# Altium schematic symbol library Hydra_Ref_sch.SCHLIB: 791 symbols (part 3 of 5)
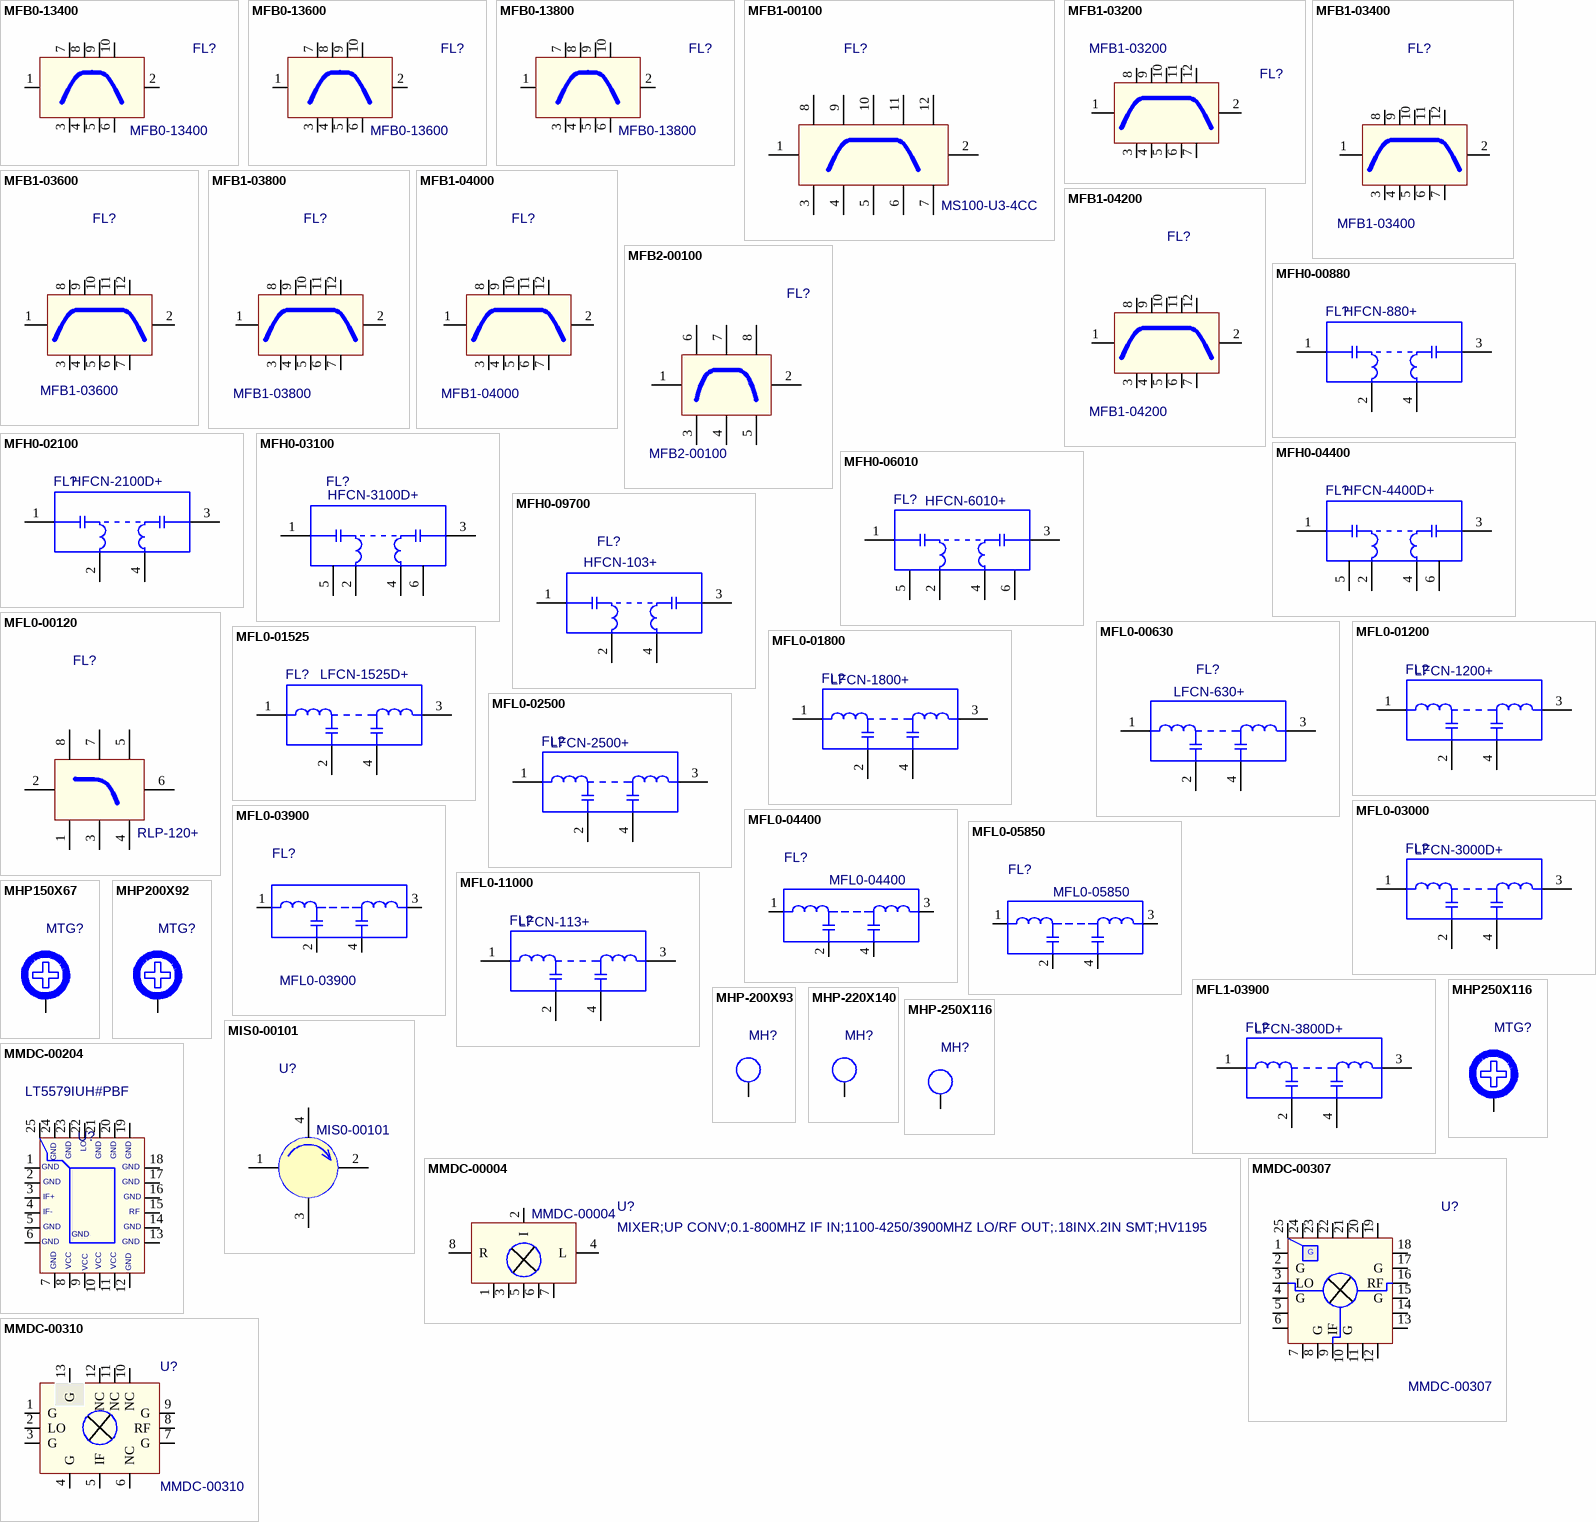
[diagram p24: symbols MFB0-13400 to MMDC-00310]

## MFH0-06010
designator FL?, comment M_PN: HFCN-6010+  (hidden comment: FILTER;HI PASS;6010MHz;5SEC;FV1206;RoHS)
MFGR: MINI-CIRCUITS; G_PN: MFH0-06010; Approved: CL; Value: HFCN-6010+; NoLoad: .; level: 1; ModifyDate: 3/12/13; item_number: MFH0-06010
footprint FV1206-1 (MINI-CIRCUITS FV1206-1)
pins: 1 IN, 2 GND, 3 OUT, 4 GND, 5 GND, 6 GND

## MFH0-09700
designator FL?, comment M_PN: HFCN-103+  (hidden comment: FILTER;HI PASS;9700MHz;7SEC;FV1206-4;RoHS)
MFGR: MINI-CIRCUITS; G_PN: MFH0-09700; Approved: CL; Value: HFCN-103+; NoLoad: .; level: 1; ModifyDate: 1/22/15; item_number: MFH0-09700
footprint FV1206-4 (FV1206-4 Mini-Circuits)
pins: 1 IN, 2 GND, 3 OUT, 4 GND

## MFL0-00120
designator FL?, comment M_PN: RLP-120+  (hidden comment: FILTER;LOWPASS;120MHZ;SHARP SLOPE;METAL SHIELDED;GP731 SMT-8)
G_PN: MFL0-00120; NoLoad: .; Approved: CL; Value: RLP-120+; MFGR: MINI_CIRCUITS; level: 1; ModifyDate: 02/22/12; item_number: MFL0-00120
footprint FIL-GP731 (CASE STYLE GP731 -Mini-Circuit)
footprint FIL-GP731 6-GND PINS (CASE STYLE GP731 -Mini-Circuit)
pins: 1, 2, 3, 4, 5, 6, 7, 8

## MFL0-00630
designator FL?, comment M_PN: LFCN-630+  (hidden comment: FILTER;LOW PASS;630MHz;7SEC;FV1206)
MFGR: MINI-CIRCUITS; G_PN: MFL0-00630; Approved: CL; Value: LFCN-630+; NoLoad: .; level: 1; ModifyDate: 02/22/12; item_number: MFL0-00630
footprint FIL-FV1206-4P (LFCN -3800)
pins: 1 IN, 2 GND, 3 OUT, 4 GND

## MFL0-01200
designator FL?, comment M_PN: LFCN-1200+  (hidden comment: LOW PASS FILTER, 1200 MHz, SMT. FV1206, RoHS)
MFGR: MINI-CIRCUITS; G_PN: MFL0-01200; Approved: CL; Value: LFCN-1200+; NoLoad: .; level: 1; ModifyDate: 02/22/12; item_number: MFL0-01200
footprint FIL-FV1206-4P (LFCN -3800)
pins: 1 IN, 2 GND, 3 OUT, 4 GND

## MFL0-01525
designator FL?, comment M_PN: LFCN-1525D+  (hidden comment: FILTER;LO PASS;1.525GHz;7 SECTION;10W;1206;RoHS)
MFGR: MINI-CIRCUITS; G_PN: MFL0-01525; Approved: CL; Value: LFCN-1525D+; NoLoad: .; level: 1; ModifyDate: 11/10/15; item_number: MFL0-01525
footprint FV1206 (FV1206 Mini-Circuits)
pins: 1 IN, 2 GND, 3 OUT, 4 GND

## MFL0-01800
designator FL?, comment M_PN: LFCN-1800+  (hidden comment: FILTER;LOW PASS;1800MHZ;7SECTIONS;10W;FV1206;RoHS)
MFGR: MINI-CIRCUITS; G_PN: MFL0-01800; Approved: NM; Value: LFCN-1800+; NoLoad: .; level: 1; ModifyDate: 11/17/12; item_number: MFL0-01800
footprint FV1206 (FV1206 Mini-Circuits)
pins: 1 IN, 2 GND, 3 OUT, 4 GND

## MFL0-02500
designator FL?, comment M_PN: LFCN-2500+  (hidden comment: FILTER;LOW PASS;2.500GHZ;5 SECTIONS;1A;1206)
MFGR: MINI-CIRCUITS; G_PN: MFL0-02500; Approved: CL; Value: LFCN-2500+; NoLoad: .; level: 1; ModifyDate: 3/5/13; item_number: MFL0-02500
footprint FV1206 (FV1206 Mini-Circuits)
pins: 1 IN, 2 GND, 3 OUT, 4 GND

## MFL0-03000
designator FL?, comment M_PN: LFCN-3000D+  (hidden comment: LTER;LOW PASS;3.000GHZ;7 SECTIONS;.5A;1206)
MFGR: MINI-CIRCUITS; G_PN: MFL0-03000; Approved: CL; Value: LFCN-3000D+; NoLoad: .; level: 1; ModifyDate: 3/8/13; item_number: MFL0-03000
footprint FV1206 (FV1206 Mini-Circuits)
pins: 1 IN, 2 GND, 3 OUT, 4 GND

## MFL0-03900
designator FL?, comment G_PN: MFL0-03900  (hidden comment: FILTER;LOW PASS;3900MHz;7SEC;FV1206)
NoLoad: .; MFGR: Mini-Circuits; Approved: NM; level: 1; ModifyDate: 11/17/12; M_PN: LFCN-3800; item_number: MFL0-03900
footprint FV1206 (FV1206 Mini-Circuits)
pins: 1 IN, 2 OUT, 3 GND, 4 GND

## MFL0-04400
designator FL?, comment G_PN: MFL0-04400  (hidden comment: FILTER;LOW PASS;4400MHz;7SEC;FV1206)
NoLoad: .; MFGR: Mini-Circuits; Approved: NM; level: 1; Value: LFCN-4400; ModifyDate: 11/17/12; M_PN: LFCN-4400; item_number: MFL0-04400
footprint FV1206 (FV1206 Mini-Circuits)
pins: 1 IN, 2 OUT, 3 GND, 4 GND

## MFL0-05850
designator FL?, comment G_PN: MFL0-05850  (hidden comment: FILTER;LOW PASS;5.85GHZ;7 SECTIONS;FV1206)
NoLoad: .; Value: LFCN-5850D+; MFGR: Mini-Circuits; Approved: NM; level: 1; ModifyDate: 3/15/13; M_PN: LFCN-5850D+; item_number: MFL0-05850
footprint FV1206 (Footprint not found)
pins: 1 IN, 2 OUT, 3 GND, 4 GND

## MFL0-11000
designator FL?, comment M_PN: LFCN-113+  (hidden comment: TER;LOW PASS;11.000GHZ;7 SECTIONS;.5A;FV1206-4)
MFGR: MINI-CIRCUITS; G_PN: MFL0-11000; Approved: CL; Value: LFCN-113+; NoLoad: .; level: 1; ModifyDate: 3/14/13; item_number: MFL0-11000
footprint FV1206-4 (FV1206-4 Mini-Circuits)
pins: 1 IN, 2 GND, 3 OUT, 4 GND

## MFL1-03900
designator FL?, comment M_PN: LFCN-3800D+  (hidden comment: FILTER;LOW PASS;3900MHz;7SEC;RoHS;FV1206)
MFGR: MINI-CIRCUITS; G_PN: MFL1-03900; Approved: CL; Value: LFCN-3800D+; NoLoad: .; level: 1; ModifyDate: 3/21/13; item_number: MFL1-03900
footprint FV1206 (Footprint not found)
pins: 1 IN, 2 GND, 3 OUT, 4 GND

## MHP150X67
designator MTG?  (no BOM)
MHP200X92; NoLoad: N/L; level: 1; ModifyDate: 02/14/2008 14:07:19; Value: *
footprint MHP150X67
pins: MH

## MHP200X92
designator MTG?  (no BOM)
MHP200X92; NoLoad: N/L; level: 1; ModifyDate: 02/14/2008 14:07:19; Value: *
footprint MHP200X92
pins: MH

## MHP250X116
designator MTG?  (no BOM)
MHP250X116; NoLoad: N/L; level: 1; ModifyDate: 8/8/13; Value: *
footprint MHP-250X116 (Mounting PT Hole .116" Pad .250" (outer layers) and .140" (inner layer))
pins: MH

## MHP-200X93
designator MH?, comment N/L  (value not drawn)  (no BOM)
MHP-200X93; level: 1; NoLoad: N/L; ModifyDate: 02/14/2008 14:07:19; Value: *
footprint MHP-200X93 (Mounting PT Hole .093" Pad .200")
footprint MTG_PAD220B170T140H (Pad 220 on the bottom and 170 on the top side)
pins: MH

## MHP-220X140
designator MH?, comment N/L  (value not drawn)  (no BOM)
MHP-220X140; level: 1; NoLoad: N/L; ModifyDate: 02/14/2008 14:07:19; Value: *
footprint MTG_PAD220B170T140H (Pad 220 on the bottom and 170 on the top side)
footprint MTG_PAD220X140
pins: MH

## MHP-250X116
designator MH?, comment N/L  (value not drawn)  (no BOM)
MHP-250X116; level: 1; NoLoad: N/L; ModifyDate: 02/14/2008 14:07:19; Value: *
footprint MHP-250X116 (Mounting PT Hole .116" Pad .250" (outer layers) and .140" (inner layer))
pins: 1

## MIS0-00101
designator U?, comment G_PN: MIS0-00101  (hidden comment: ISOLATOR;1.165-1.235GHZ;20DB;0.35dB IL;0.98dBSMT)
MFGR: JQL; NoLoad: .; Approved: CL; Value: JCM1165T1235S10R; level: 1; ModifyDate: 4/3/12; M_PN: JCM1165T1235S10R; item_number: MIS0-00101
footprint JCM1165T1235S10R (Isolator)
pins: 1, 2, 3, 4  

## MMDC-00004
designator U?, comment MIXER;UP CONV;0.1-800MHZ IF IN;1100-4250/3900MHZ LO/RF OUT;.18INX.2IN SMT;HV1195  G_PN: MMDC-00004
Approved: NM; MFGR: Mini-Circuits; NoLoad: .; M_PN: SIM-U432+; level: 1; ModifyDate: 11/14/12; item_number: MMDC-00004
footprint HV1195 (SIM-4432H+)
pins: 1, 2 I, 3, 4 L, 5, 6, 7, 8 R

## MMDC-00204
designator U?, comment M_PN: LT5579IUH#PBF  (hidden comment: MIXER;1.5-3.8GHZ;+2DBM;0-1GHZ IF;QFN-24)
Value: LT5579IUH#PBF; NoLoad: .; Approved: CL; MFGR: LINEAR TECH; G_PN: MMDC-00204; level: 1; ModifyDate: 2/26/13; item_number: MMDC-00204
footprint QFN-24_LT (QFN-24 LINEAR TECHNOLOGY)
pins: 1 G, 2 G, 3 IF+, 4 IF-, 5 G, 6 G, 7 G, 8 VCC, 9 VCC, 10 VCC, 11 VCC, 12 G, 13 G, 14 G, 15 RF, 16 G, 17 G, 18 G, 19 G, 20 G, 21 G, 22 LO, 23 G, 24 G, 25 G
text: GND

## MMDC-00307
designator U?, comment G_PN: MMDC-00307  (hidden comment: MIXER;6-12GHZ;+17DBM;0-3GHZ IF;.157INX.157INX.04IN SMT)
Approved: CL; MFGR: MINICIRCUITS; NoLoad: .; Value: HMC557LC4; level: 1; ModifyDate: 3/13/13; M_PN: HMC557LC4; item_number: MMDC-00307
footprint LC4_HITTITE (QFN Plastic Package 157X157X40(mil))
pins: 1 NC, 2 G, 3 LO, 4 G, 5 NC, 6 NC, 7 NC, 8 G, 9 IF, 10 G, 11 NC, 12 NC, 13 NC, 14 NC, 15 G, 16 RF, 17 G, 18 NC, 19 NC, 20 NC, 21 NC, 22 NC, 23 NC, 24 NC, 25 G

## MMDC-00310
designator U?  G_PN: MMDC-00310
MIXER;3-10GHZ;+17DBM;0-4GHZ IF;.118INX.118INX.036IN SMT; MFGR: HITTITE; NoLoad: .; Value: HMC787LC3B; level: 1; ModifyDate: 1/15/14; M_PN: HMC787LC3B; item_number: MMDC-00310
footprint QFN-12_HITTITE_LC3 (Footprint not found)
pins: 1 G, 2 LO "This pin is AC coupled  and matched to 50 Ohms.", 3 G "These pins and package base must  be connected to RF/DC ground.", 4 G "These pins and package base must  be connected to RF/DC ground.", 5 IF "This pad is DC coupled. For applications not requiring  operation to DC, this port should be DC blocked externally  using a series capacitor whose value has been chosen to  pass the necessary IF frequency range. For operation to DC,  this pin must not source or sink more than 2 mA of current or  part non-function and possible part failure will result.", 6 NC, 7 G, 8 RF, 9 G, 10 NC, 11 NC "This pin is AC coupled  and matched to 50 Ohms.", 12 NC "These pins and package base must  be connected to RF/DC ground.", 13 G "PADDLE"

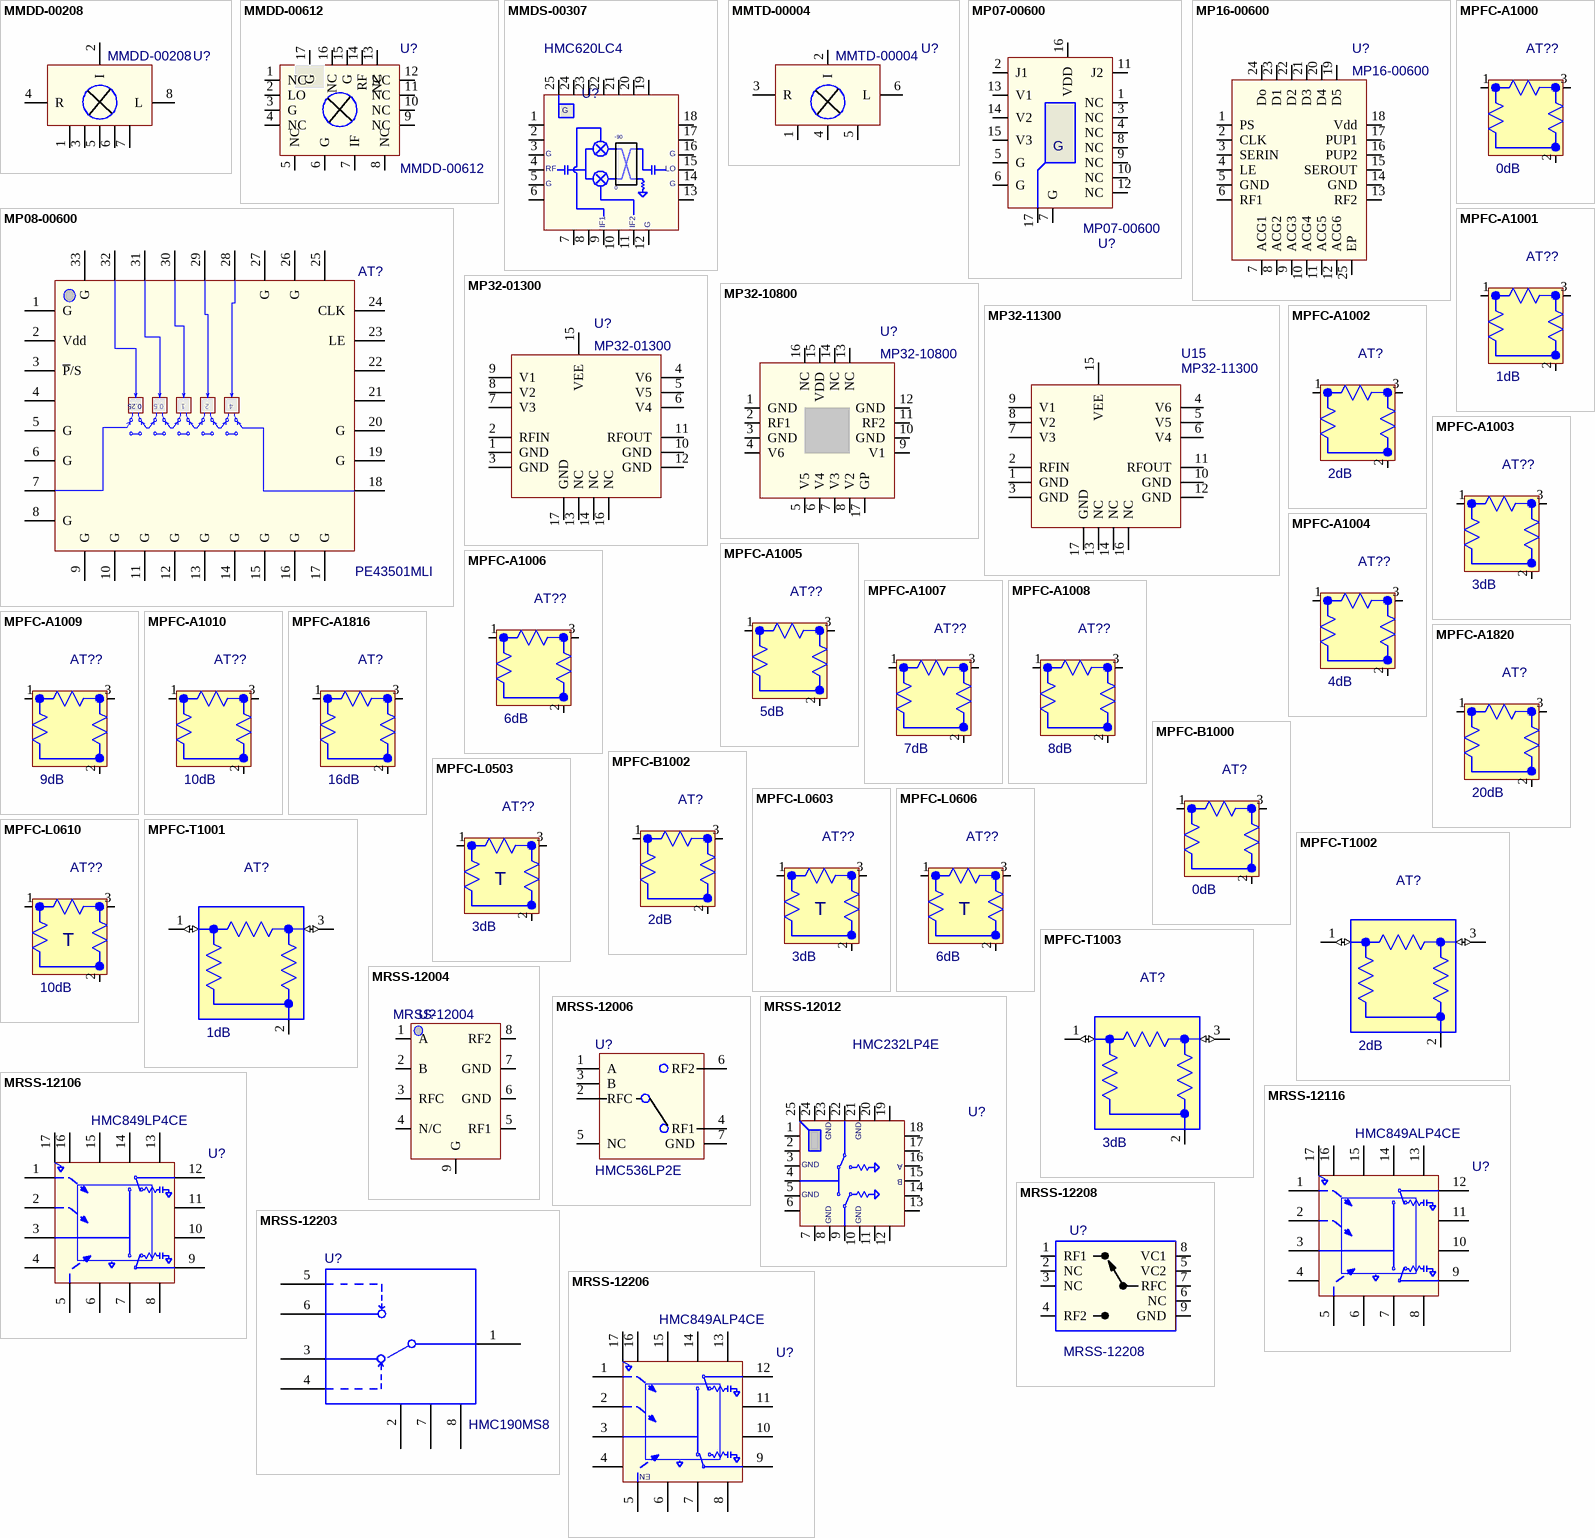
[diagram p10: symbols MMDD-00208 to MRSS-12208]

## MMDD-00208
designator U?, comment G_PN: MMDD-00208  (hidden comment: MIXER;2.3-7.6GHZ;+17DBM;0-3GHZ IF;.18INX.2IN SMT;HV1195)
Approved: NM; MFGR: MINICIRCUITS; NoLoad: .; M_PN: SIM-762H+; level: 1; ModifyDate: 11/14/12; item_number: MMDD-00208
footprint HV1195 (SIM-4432H+)
pins: 1, 2 I, 3, 4 R, 5, 6, 7, 8 L

## MMDD-00612
designator U?  G_PN: MMDD-00612
MIXER;6-12GHZ;+17DBM;0-4GHZ IF;.118INX.118INX.036IN SMT; MFGR: HITTITE; NoLoad: .; Value: HMC663LC3; level: 1; ModifyDate: 9/17/13; M_PN: HMC663LC3; item_number: MMDD-00612
footprint QFN-16_HITTITE_LC3_036 (LC3 – 3 x 3 mm QFN CERAMIC  HIGH FREQUENCY SMT PACKAGE, 36mil height)
pins: 1 NC, 2 LO "This pin is AC coupled  and matched to 50 Ohms.", 3 G "These pins and package base must  be connected to RF/DC ground.", 4 NC, 5 NC, 6 G "These pins and package base must  be connected to RF/DC ground.", 7 IF "This pad is DC coupled. For applications not requiring  operation to DC, this port should be DC blocked externally  using a series capacitor whose value has been chosen to  pass the necessary IF frequency range. For operation to DC,  this pin must not source or sink more than 2 mA of current or  part non-function and possible part failure will result.", 8 NC, 9 NC, 10 NC, 11 NC, 12 NC, 13 NC, 14 RF "This pin is AC coupled  and matched to 50 Ohms.", 15 G "These pins and package base must  be connected to RF/DC ground.", 16 NC, 17 G "PADDLE"

## MMDS-00307
designator U?, comment M_PN: HMC620LC4  (hidden comment: MIXER;3-7GHZ;+15DBM;0-3.5GHZ IF;.157INX.157INX.040IN QFN-24;SSB)
Value: HMC620LC4; NoLoad: .; Approved: CL; MFGR: HITTITE; G_PN: MMDS-00307; level: 1; ModifyDate: 4/12/13; item_number: MMDS-00307
footprint QFN-24_HITTITE (QFN-24 HITTITE)
pins: 1 NC, 2 NC, 3 G, 4 RF, 5 G, 6 NC, 7 NC, 8 NC, 9 IF1, 10 NC, 11 VCC, 12 G, 13 NC, 14 G, 15 LO, 16 G, 17 NC, 18 NC, 19 NC, 20 NC, 21 NC, 22 NC, 23 NC, 24 NC, 25 NC
text: -90; 0; IF2

## MMTD-00004
designator U?, comment G_PN: MMTD-00004  (hidden comment: MIXER;UP CONV;5-3500MHZ IF IN;5-4200MHZ LO/RF;CD542;RoHS)
Approved: NM; MFGR: MINI-CIRCUITS; NoLoad: .; Value: ADE-42MH+; level: 1; ModifyDate: 4/9/13; M_PN: ADE-42MH+; item_number: MMTD-00004
footprint CD542 (Footprint not found)
pins: 1 GND, 2 I, 3 R, 4 GND, 5 GND, 6 L

## MP07-00600
designator U?, comment G_PN: MP07-00600  (hidden comment: ATTENUATOR;3-BIT CONT;7DB;0.5-6GHZ;QFN-16)
M_PN: SKY12325-350LF; MFGR: SKYWORKS; NoLoad: .; Approved: NB; level: 1; Value: *; ModifyDate: 11/8/12; item_number: MP07-00600
footprint QFN50P300x300x80-17N (QFN-16PIN-3MMx3MM_.5mm Pitch .8 mm tall Nominal footprint)
pins: 1 NC, 2 J1, 3 NC, 4 NC, 5 G, 6 G, 7 G, 8 NC, 9 NC, 10 NC, 11 J2, 12 NC, 13 V1, 14 V2, 15 V3, 16 VDD, 17 G

## MP08-00600
designator AT?, comment M_PN: PE43501MLI  (hidden comment: ATTENUATOR;7.75DB;9KHZ-6GHZ;5-BIT S/P CONT;QFN-32)
MFGR: PEREGRINE SEMICONDUCTOR; Approved: CL; NoLoad: .; Value: PE43501MLI; G_PN: MP08-00600; level: 1; ModifyDate: 5/17/12; item_number: MP08-00600
footprint QFN50P500X500X90-33N (QFN, 33-Leads, Body 5x5x0.9mm, Pitch 0.50mm, IPC Medium Density)
pins: 1 G, 2 Vdd, 3 ~{P}/S, 4 A0, 5 G, 6 G, 7 N/C, 8 G, 9 G, 10 G, 11 G, 12 G, 13 G, 14 G, 15 G, 16 G, 17 G, 18 RF2, 19 G, 20 G, 21 A2, 22 A1, 23 LE, 24 CLK, 25 SI, 26 G, 27 G, 28 D4, 29 D3, 30 D2, 31 D1, 32 D0, 33 G
text: 0.25; 0.5

## MP16-00600
designator U?, comment G_PN: MP16-00600  (hidden comment: HMC792LP4E,15.75DB,6-BIT,6 GHz,MMIC ATTEN,.25 dB STEP,IL<4dB,SMT LEADLESS 4mmX4mm PKG.)
MFGR: HITTITE; NoLoad: .; Approved: NM; level: 1; Value: HMC792LP4E; M_PN: HMC792LP4E; ModifyDate: 3/4/13; item_number: MP16-00600
footprint QFN50P400X400X100-25N
pins: 1 PS, 2 CLK, 3 SERIN, 4 LE, 5 GND, 6 RF1, 7 ACG1, 8 ACG2, 9 ACG3, 10 ACG4, 11 ACG5, 12 ACG6, 13 RF2, 14 GND, 15 SEROUT, 16 PUP2, 17 PUP1, 18 Vdd, 19 D5, 20 D4, 21 D3, 22 D2, 23 D1, 24 Do, 25 EP "exposed pad"

## MP32-01300
designator U?, comment G_PN: MP32-01300  (hidden comment: HMC424LP3,32DB,6-BIT,13 GHz,MMIC ATTEN,.5 dB STEP,IL<4dB,SMT LEADLESS 9mmX9mm PKG.)
MFGR: HITTITE; NoLoad: .; Approved: NM; level: 1; Value: *; M_PN: HMC424LP3; ModifyDate: 12/05/12; item_number: MP32-01300
footprint QFN-16_HITTITE_LP3 (QFN-16 HITTITE)
pins: 1 GND, 2 RFIN, 3 GND, 4 V6, 5 V5, 6 V4, 7 V3, 8 V2, 9 V1, 10 GND, 11 RFOUT, 12 GND, 13 NC, 14 NC, 15 VEE, 16 NC, 17 GND

## MP32-10800
designator U?, comment G_PN: MP32-10800  (hidden comment: HMC792LP4E,15.75DB,6-BIHMC425LP3E,32DB,6-BIT,8 GHz,MMIC ATTEN,.5 dB STEP,IL<5B,SMT LEADLESS 3mmX3mm PKG.)
MFGR: HITTITE; NoLoad: .; Approved: CL; level: 1; Value: HMC425LP3E; M_PN: HMC425LP3E; ModifyDate: 5/1/15; item_number: MP32-10800
footprint QFN-16_HITTITE_LP3 (QFN-16 HITTITE)
pins: 1 GND, 2 RF1, 3 GND, 4 V6, 5 V5, 6 V4, 7 V3, 8 V2, 9 V1, 10 GND, 11 RF2, 12 GND, 13 NC, 14 NC, 15 VDD, 16 NC, 17 GP

## MP32-11300
designator U15, comment G_PN: MP32-11300  (hidden comment: HMC424LP3,32DB,6-BIT,13 GHz,MMIC ATTEN,.5 dB STEP,IL<4dB,SMT LEADLESS 3mmX3mm PKG.)
M_PN: HMC424ALP3E; MFGR: HITTITE; NoLoad: .; Approved: CL; Value: *; ModifyDate: 8/2/15; item_number: MP32-11300
footprint QFN-16_HITTITE_LP3 (QFN-16 HITTITE)
pins: 1 GND, 2 RFIN, 3 GND, 4 V6, 5 V5, 6 V4, 7 V3, 8 V2, 9 V1, 10 GND, 11 RFOUT, 12 GND, 13 NC, 14 NC, 15 VEE, 16 NC, 17 GND

## MPFC-A1000
designator AT??, comment value 0dB  (hidden comment: PAD;CHIP;0dB;+/-.3dB;.08 x .05;50 OHM;FACE DOWN)
NoLoad: .; Approved: CL; M_PN: IMS1141-00DB; MFGR: IMS RESISTORS; G_PN: MPFC-A1000; level: 1; ModifyDate: 4/16/13; item_number: MPFC-A1000
footprint ATTN-IMS-0805 (Footprint not found)
pins: 1 IN/OUT, 2 GND (power), 3 IN/OUT

## MPFC-A1001
designator AT??, comment value 1dB  (hidden comment: PAD;CHIP;1dB;+/-.3dB;.08 x .05;50 OHM;FACE DOWN)
NoLoad: .; Approved: CL; M_PN: IMS1141-01DB; MFGR: IMS RESISTORS; G_PN: MPFC-A1001; level: 1; ModifyDate: 3/8/13; item_number: MPFC-A1001
footprint ATTN-IMS-0805 (Footprint not found)
pins: 1 IN/OUT, 2 GND (power), 3 IN/OUT

## MPFC-A1002
designator AT?, comment value 2dB  (hidden comment: PAD;CHIP;2dB;+/-.3dB;.08 x .05;50 OHM;FACE DOWN)
NoLoad: .; Approved: CL; M_PN: IMS1141-02DB; MFGR: IMS RESISTORS; G_PN: MPFC-A1002; level: 1; ModifyDate: 3/8/13; item_number: MPFC-A1002
footprint ATTN-IMS-0805 (Footprint not found)
footprint ATTN-IMS-0805 (ATTENUATOR, 0805, IMS)
pins: 1 IN/OUT, 2 GND (power), 3 IN/OUT

## MPFC-A1003
designator AT??, comment value 3dB  (hidden comment: PAD;CHIP;3dB;+/-.3dB;.08 x .05;50 OHM;FACE DOWN)
NoLoad: .; Approved: CL; M_PN: IMS1141-03DB; MFGR: IMS RESISTORS; G_PN: MPFC-A1003; level: 1; item_number: MPFC-A1003
footprint ATTN-IMS-0805 (Footprint not found)
pins: 1 IN/OUT, 2 GND (power), 3 IN/OUT

## MPFC-A1004
designator AT??, comment value 4dB  (hidden comment: PAD;CHIP;4dB;+/-.3dB;.08 x .05;50 OHM;FACE DOWN)
NoLoad: .; Approved: CL; M_PN: IMS1141-04DB; MFGR: IMS RESISTORS; G_PN: MPFC-A1004; level: 1; ModifyDate: 3/8/13; item_number: MPFC-A1004
footprint ATTN-IMS-0805 (Footprint not found)
pins: 1 IN/OUT, 2 GND (power), 3 IN/OUT

## MPFC-A1005
designator AT??, comment value 5dB  (hidden comment: PAD;CHIP;5dB;+/-.3dB;.08 x .05;50 OHM;FACE DOWN)
NoLoad: .; Approved: CL; M_PN: IMS1141-05DB; MFGR: IMS RESISTORS; G_PN: MPFC-A1005; level: 1; ModifyDate: 3/8/13; item_number: MPFC-A1005
footprint ATTN-IMS-0805 (Footprint not found)
pins: 1 IN/OUT, 2 GND (power), 3 IN/OUT

## MPFC-A1006
designator AT??, comment value 6dB  (hidden comment: PAD;CHIP;6dB;+/-.3dB;.08 x .05;50 OHM;FACE DOWN)
NoLoad: .; Approved: CL; M_PN: IMS1141-06DB; MFGR: IMS RESISTORS; G_PN: MPFC-A1006; level: 1; ModifyDate: 3/8/13; item_number: MPFC-A1006
footprint ATTN-IMS-0805 (Footprint not found)
pins: 1 IN/OUT, 2 GND (power), 3 IN/OUT

## MPFC-A1007
designator AT??, comment value 7dB  (hidden comment: PAD;CHIP;7dB;+/-.3dB;.08 x .05;50 OHM;FACE DOWN)
NoLoad: .; Approved: CL; M_PN: IMS1141-07DB; MFGR: IMS RESISTORS; G_PN: MPFC-A1007; level: 1; ModifyDate: 8/5/14; item_number: MPFC-A1007
footprint ATTN-IMS-0805 (Footprint not found)
pins: 1 IN/OUT, 2 GND (power), 3 IN/OUT

## MPFC-A1008
designator AT??, comment value 8dB  (hidden comment: PAD;CHIP;8dB;+/-.3dB;.08 x .05;50 OHM;FACE DOWN)
NoLoad: .; Approved: CL; M_PN: IMS1141-08DB; MFGR: IMS RESISTORS; G_PN: MPFC-A1008; level: 1; ModifyDate: 4/23/13; item_number: MPFC-A1008
footprint ATTN-IMS-0805 (Footprint not found)
pins: 1 IN/OUT, 2 GND (power), 3 IN/OUT

## MPFC-A1009
designator AT??, comment value 9dB  (hidden comment: PAD;CHIP;9dB;+/-.3dB;.08 x .05;50 OHM;FACE DOWN)
NoLoad: .; Approved: CL; M_PN: IMS1141-09DB; MFGR: IMS RESISTORS; G_PN: MPFC-A1009; level: 1; ModifyDate: 3/.8/13; item_number: MPFC-A1009
footprint ATTN-IMS-0805 (Footprint not found)
pins: 1 IN/OUT, 2 GND (power), 3 IN/OUT

## MPFC-A1010
designator AT??, comment value 10dB  (hidden comment: PAD;CHIP;10dB;+/-.3dB;.08 x .05;50 OHM;FACE DOWN)
NoLoad: .; Approved: CL; M_PN: IMS1141-10DB; MFGR: IMS RESISTORS; G_PN: MPFC-A1010; level: 1; ModifyDate: 4/23/13; item_number: MPFC-A1010
footprint ATTN-IMS-0805 (Footprint not found)
pins: 1 IN/OUT, 2 GND (power), 3 IN/OUT

## MPFC-A1816
designator AT?, comment value 16dB  (hidden comment: PAD;CHIP;16dB;+.5/-4dB;.08 x .06;50 OHM;FACE DOWN)
NoLoad: .; Approved: CL; M_PN: PCAAW-16; MFGR: Aeroflex/Inmet; G_PN: MPFC-A1816; level: 1; ModifyDate: 8/21/14; item_number: MPFC-A1816
footprint PCAAW (Footprint not found)
pins: 1 IN/OUT, 2 GND (power), 3 IN/OUT

## MPFC-A1820
designator AT?, comment value 20dB  (hidden comment: PAD;CHIP;20dB;+.5/-4dB;.08 x .06;50 OHM;FACE DOWN)
NoLoad: .; Approved: CL; M_PN: MPFC-A1820; MFGR: Aeroflex/Inmet; level: 1; ModifyDate: 1/20/15; G_PN: MPFC-A1820; item_number: MPFC-A1820
footprint PCAAW (Footprint not found)
pins: 1 IN/OUT, 2 GND (power), 3 IN/OUT

## MPFC-B1000
designator AT?, comment value 0dB  (hidden comment: PAD;CHIP;0dB;.06 x .03;50 OHM;FACE DOWN)
NoLoad: .; Approved: CL; M_PN: IMS-2533-00DB; MFGR: IMS RESISTORS; G_PN: MPFC-B1000; level: 1; ModifyDate: 6/23/16; item_number: MPFC-B1000
footprint ATTN-IMS-0603 (Footprint not found)
pins: 1 IN/OUT, 2 GND (power), 3 IN/OUT

## MPFC-B1002
designator AT?, comment value 2dB  (hidden comment: PAD;CHIP;2dB;.06 x .03;50 OHM;FACE DOWN)
NoLoad: .; Approved: CL; M_PN: IMS-2533-02DB; MFGR: IMS RESISTORS; G_PN: MPFC-B1002; level: 1; ModifyDate: 10/18/16; item_number: MPFC-B1002
footprint ATTN-IMS-0603 (Footprint not found)
pins: 1 IN/OUT, 2 GND (power), 3 IN/OUT

## MPFC-L0503
designator AT??, comment value 3dB  (hidden comment: TEMP VAR CHIP ATTEN;3DB;-6E-3 TC;DC-6GHz;.147X.123)
NoLoad: .; Approved: CL; M_PN: TVA0300N07W3S; MFGR: EMC TECHNOLOGY; G_PN: MPFC-L0503; level: 1; ModifyDate: 3/13/13; item_number: MPFC-L0503
footprint TVA3S (ATTENUATOR, .140" x .123")
pins: 1 IN/OUT, 2 GND (power), 3 IN/OUT
text: T

## MPFC-L0603
designator AT??, comment value 3dB  (hidden comment: TEMP VAR CHIP ATTEN;3DB;-3E-3 TC;DC-6GHz;.147X.123)
NoLoad: .; Approved: CL; M_PN: TVA0300N03W3F; MFGR: EMC TECHNOLOGY; G_PN: MPFC-L0603; level: 1; ModifyDate: 3/8/13; item_number: MPFC-L0603
footprint TVA0600N03W3F (Footprint not found)
pins: 1 IN/OUT, 2 GND (power), 3 IN/OUT
text: T

## MPFC-L0606
designator AT??, comment value 6dB  (hidden comment: TEMP VARIABLE CHIP ATTENUATOR;6DB;DC-6GHz)
NoLoad: .; Approved: CL; M_PN: TVA0600N03W3F; MFGR: EMC TECHNOLOGY; G_PN: MPFC-L0606; level: 1; ModifyDate: 3/8/13; item_number: MPFC-L0606
footprint TVA0600N03W3F (Footprint not found)
pins: 1 IN/OUT, 2 GND (power), 3 IN/OUT
text: T

## MPFC-L0610
designator AT??, comment value 10dB  (hidden comment: TEMP VAR CHIP ATTEN;10DB;-7E-3 TC;DC-6GHz;.147X.123)
NoLoad: .; Approved: CL; M_PN: TVA1000N07W3S; MFGR: EMC TECHNOLOGY; G_PN: MPFC-L0610; level: 1; ModifyDate: 3/13/13; item_number: MPFC-L0610
footprint TVA3S (Footprint not found)
pins: 1 IN/OUT, 2 GND (power), 3 IN/OUT
text: T

## MPFC-T1001
designator AT?  value 1dB  (hidden comment: MPFC-T1001)
PAD;CHIP;1dB;+/-.3dB;.08 x .05;50 OHM; NoLoad: .; Approved: {Approved}; M_PN: PAT 1220 C 01dB B; MFGR: Thin Film Technology; level: 1; G_PN: MPFC-T1001; item_number: MPFC-T1001
footprint ATTN-PAT1220 (ATTENUATOR, PAT 1220)
pins: 1 IN/OUT (io), 2 GND (power), 3 IN/OUT (io)

## MPFC-T1002
designator AT?  value 2dB  (hidden comment: MPFC-T1002)
PAD;CHIP;2dB;+/-.3dB;.08 x .05;50 OHM; NoLoad: .; Approved: {Approved}; M_PN: PAT 1220 C 02dB B; MFGR: Thin Film Technology; level: 1; G_PN: MPFC-T1002; item_number: MPFC-T1002
footprint ATTN-PAT1220 (ATTENUATOR, PAT 1220)
pins: 1 IN/OUT (io), 2 GND (power), 3 IN/OUT (io)

## MPFC-T1003
designator AT?  value 3dB  (hidden comment: MPFC-T1003)
PAD;CHIP;3dB;+/-.3dB;.08 x .05;50 OHM; NoLoad: .; Approved: {Approved}; M_PN: PAT 1220 C 03dB B; MFGR: Thin Film Technology; level: 1; G_PN: MPFC-T1003; item_number: MPFC-T1003
footprint ATTN-PAT1220 (ATTENUATOR, PAT 1220)
pins: 1 IN/OUT (io), 2 GND (power), 3 IN/OUT (io)

## MRSS-12004
designator U?, comment G_PN: MRSS-12004  (hidden comment: GaAs;MSPDT;NON-REFLECTIVE;SWITCH;DC - 3.5 GHz)
Value: HMC284MS8GE; MFGR: HITTITE; NoLoad: .; Approved: CL; level: 1; ModifyDate: 6/1/13; M_PN: HMC284MS8GE; item_number: MRSS-12004
footprint MS8GE (RoHS Mold Compound 192X118X43(mil))
pins: 1 A, 2 B, 3 RFC, 4 N/C, 5 RF1, 6 GND, 7 GND, 8 RF2, 9 G

## MRSS-12006
designator U?, comment M_PN: HMC536LP2E  (hidden comment: SWITCH;SPDT;6GHZ;29DB ISO;29DBM P0.1DB;+BIAS;2X2MM DFN-6 W/GND PAD)
MFGR: Hittite; NoLoad: .; Approved: NM; G_PN: MRSS-12006; level: 1; Value: *; ModifyDate: 10/24/12; item_number: MRSS-12006
footprint DFN200x200x100-6N
pins: 1 A, 2 RFC, 3 B, 4 RF1, 5 NC, 6 RF2, 7 GND

## MRSS-12012
designator U?, comment M_PN: HMC232LP4E  (hidden comment: MMIC SPDT;NON-REFLECTIVE;SWITCH;DC -12 GHz;RoHS)
MFGR: HITTITE; Approved: CL; G_PN: MRSS-12012; Value: HMC232LP4E; NoLoad: .; level: 1; ModifyDate: 4/8/13; item_number: MRSS-12012
footprint QFN-24_HITTITE (QFN-24 HITTITE)
pins: 1 Vdd, 2 Vctl, 3 G, 4 NC, 5 G, 6 NC, 7 NC, 8 G, 9 RF1, 10 G, 11 NC, 12 RF2, 13 NC, 14 NC, 15 B, 16 A, 17 NC, 18 NC, 19 NC, 20 NC, 21 G, 22 RF2, 23 G, 24 NC, 25 G
text: GND

## MRSS-12106
designator U?, comment M_PN: HMC849LP4CE  (hidden comment: SWITCH;SPDT;DC-6GHz;40DB ISO;34DBM;3-5V CTRL;QFN-16)
MFGR: HITTITE; Approved: CL; G_PN: MRSS-12106; Value: HMC849LP4CE; NoLoad: .; level: 1; ModifyDate: 3/11/13; item_number: MRSS-12106
footprint QFN-16_HITTITE_LP3 (QFN-16 HITTITE)
pins: 1 Vdd, 2 Vctl, 3 RFC, 4 NC, 5 EN, 6 NC, 7 NC, 8 NC, 9 RF1, 10 GND, 11 GND, 12 RF2, 13 NC, 14 NC, 15 NC, 16 NC, 17 GND

## MRSS-12116
designator U?, comment M_PN: HMC849ALP4CE  (hidden comment: SWITCH;SPDT;DC-6GHz;40DB ISO;34DBM;3-5V CTRL;QFN-16)
MFGR: HITTITE; Approved: CL; G_PN: MRSS-12116; Value: HMC849ALP4CE; NoLoad: .; level: 1; ModifyDate: 8/26/14; item_number: MRSS-12116
footprint QFN-16_HITTITE_LP4CE (LP4C (E) – 4 x 4 mm QUAD FLATPACK  NO-LEAD (QFN) PLASTIC PACKAGE, 1mm)
pins: 1 Vdd, 2 Vctl, 3 RFC, 4 NC, 5 EN, 6 NC, 7 NC, 8 NC, 9 RF1, 10 GND, 11 GND, 12 RF2, 13 NC, 14 NC, 15 NC, 16 NC, 17 GND

## MRSS-12203
designator U?, comment M_PN: HMC190MS8  (hidden comment: SWITCH;SPDT;3GHz;27DB ISO;50DBM;+BIAS;S8)
Value: HMC190MS8; G_PN: MRSS-12203; NoLoad: .; Approved: CL; MFGR: Hittite; level: 1; ModifyDate: 4/16/12; item_number: MRSS-12203
footprint MSOP8_3.0_.65 (old part)
pins: 1 RFC, 2 GND, 3 RF1, 4 A, 5 B, 6 RF2, 7 GND, 8 GND

## MRSS-12206
designator U?, comment M_PN: HMC849ALP4CE  (hidden comment: SWITCH;SPDT;DC-6GHz;50DB ISO;33DBM;3-5V CTRL;QFN-16)
MFGR: HITTITE; Approved: CL; G_PN: MRSS-12206; Value: HMC849ALP4CE; NoLoad: .; level: 1; ModifyDate: 8/5/14; item_number: MRSS-12206
footprint QFN-16_HITTITE_LP4CE (LP4C (E) – 4 x 4 mm QUAD FLATPACK  NO-LEAD (QFN) PLASTIC PACKAGE, 1mm)
pins: 1 Vdd, 2 Vctl, 3 RFC, 4 NC, 5 EN, 6 NC, 7 NC, 8 NC, 9 RF1, 10 GND, 11 GND, 12 RF2, 13 NC, 14 NC, 15 NC, 16 NC, 17 GND

## MRSS-12208
designator U?, comment G_PN: MRSS-12208  (hidden comment: SPDT SWITCH,DC-8.0 GHz,GaAs,IL .5 dB, SMT 2mm PDFN-8, RoHS)
M_PN: MASW-007107; NoLoad: .; Approved: NM; MFGR: MA-COM; level: 1; ModifyDate: 12/06/12; item_number: MRSS-12208
footprint SON50P200X200-X100-9N (SON 8+1 Leads, Body 2x2mm (nominal), Pitch .0.50mm, IPC Medium Density)
pins: 1 RF1, 2 NC, 3 NC, 4 RF2, 5 VC2, 6 NC, 7 RFC, 8 VC1, 9 GND
